# Altium schematic symbol library jlcpcb_2025_04_capacitors_extended_0201.schlib: 1175 symbols (part 4 of 7) (continued)
## GJM0335C1E9R2BB01D
designator C?  Capacitance: 9.2pF  (hidden comment: *)
Capacitor, Ceramic (MLCC), 9.2pF, 25V, C0G, SMD 0201; Manufacturer: Murata Electronics; Manufacturer Part Number: GJM0335C1E9R2BB01D; Package Size: 0201; JLCPCB Basic Part: No; JLCPCB Part Number: C3019008; Supplier 1: LCSC; Category: Capacitors - MLCC; Supplier Part Number 1: C3019008; Voltage Rating: 25V; Temperature Coefficient: C0G; RoHS: Yes; ComponentLink1Description: Datasheet; ComponentLink1URL: https://wmsc.lcsc.com/wmsc/upload/file/pdf/v2/lcsc/2205191730_Murata-Electronics-GJM0335C1E9R2BB01D_C3019008.pdf; ComponentLink2Description: JLCPCB Part URL; ComponentLink2URL: https://jlcpcb.com/partdetail/C3019008; ComponentLink3Description: LCSC Part URL; ComponentLink3URL: https://lcsc.com/product-detail/Multilayer-Ceramic-Capacitors-MLCC---SMD-SMT_Murata-Electronics-Murata-Electronics-GJM0335C1E9R2BB01D_C3019008.html
footprint CAP-0201 (0201 (0603M) Capacitor)
pins: 1, 2

## GJM0335C1E9R9BB01D
designator C?  Capacitance: 9.9pF  (hidden comment: *)
Capacitor, Ceramic (MLCC), 9.9pF, 25V, C0G, SMD 0201; Manufacturer: Murata Electronics; Manufacturer Part Number: GJM0335C1E9R9BB01D; Package Size: 0201; JLCPCB Basic Part: No; JLCPCB Part Number: C3018996; Supplier 1: LCSC; Category: Capacitors - MLCC; Supplier Part Number 1: C3018996; Voltage Rating: 25V; Temperature Coefficient: C0G; RoHS: Yes; ComponentLink1Description: Datasheet; ComponentLink1URL: https://wmsc.lcsc.com/wmsc/upload/file/pdf/v2/lcsc/2205191730_Murata-Electronics-GJM0335C1E9R9BB01D_C3018996.pdf; ComponentLink2Description: JLCPCB Part URL; ComponentLink2URL: https://jlcpcb.com/partdetail/C3018996; ComponentLink3Description: LCSC Part URL; ComponentLink3URL: https://lcsc.com/product-detail/Multilayer-Ceramic-Capacitors-MLCC---SMD-SMT_Murata-Electronics-Murata-Electronics-GJM0335C1E9R9BB01D_C3018996.html
footprint CAP-0201 (0201 (0603M) Capacitor)
pins: 1, 2

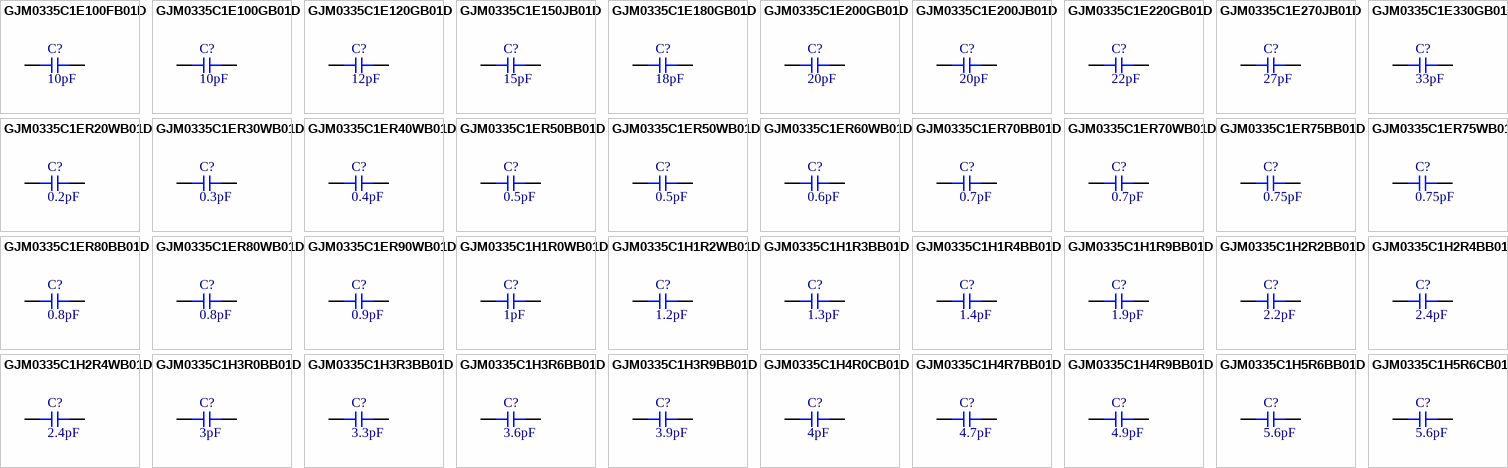
[diagram p15: symbols GJM0335C1E100FB01D to GJM0335C1H5R6CB01D]

## GJM0335C1E100FB01D
designator C?  Capacitance: 10pF  (hidden comment: *)
Capacitor, Ceramic (MLCC), 10pF, ±1%, 25V, C0G, ±1%, SMD 0201; Manufacturer: Murata Electronics; Manufacturer Part Number: GJM0335C1E100FB01D; Package Size: 0201; JLCPCB Basic Part: No; JLCPCB Part Number: C2891570; Supplier 1: LCSC; Category: Capacitors - MLCC; Supplier Part Number 1: C2891570; Tolerance: ±1%; Voltage Rating: 25V; Temperature Coefficient: C0G; RoHS: Yes; ComponentLink1Description: Datasheet; ComponentLink1URL: https://wmsc.lcsc.com/wmsc/upload/file/pdf/v2/lcsc/2109100930_Murata-Electronics-GJM0335C1E100FB01D_C2891570.pdf; ComponentLink2Description: JLCPCB Part URL; ComponentLink2URL: https://jlcpcb.com/partdetail/C2891570; ComponentLink3Description: LCSC Part URL; ComponentLink3URL: https://lcsc.com/product-detail/Multilayer-Ceramic-Capacitors-MLCC---SMD-SMT_Murata-Electronics-Murata-Electronics-GJM0335C1E100FB01D_C2891570.html
footprint CAP-0201 (0201 (0603M) Capacitor)
pins: 1, 2

## GJM0335C1E100GB01D
designator C?  Capacitance: 10pF  (hidden comment: *)
Capacitor, Ceramic (MLCC), 10pF, ±2%, 25V, C0G, ±2%, SMD 0201; Manufacturer: Murata Electronics; Manufacturer Part Number: GJM0335C1E100GB01D; Package Size: 0201; JLCPCB Basic Part: No; JLCPCB Part Number: C237422; Supplier 1: LCSC; Category: Capacitors - MLCC; Supplier Part Number 1: C237422; Tolerance: ±2%; Voltage Rating: 25V; Temperature Coefficient: C0G; RoHS: Yes; ComponentLink1Description: Datasheet; ComponentLink1URL: https://wmsc.lcsc.com/wmsc/upload/file/pdf/v2/lcsc/1912111437_Murata-Electronics-GJM0335C1E100GB01D_C237422.pdf; ComponentLink2Description: JLCPCB Part URL; ComponentLink2URL: https://jlcpcb.com/partdetail/C237422; ComponentLink3Description: LCSC Part URL; ComponentLink3URL: https://lcsc.com/product-detail/Multilayer-Ceramic-Capacitors-MLCC---SMD-SMT_Murata-Electronics-Murata-Electronics-GJM0335C1E100GB01D_C237422.html
footprint CAP-0201 (0201 (0603M) Capacitor)
pins: 1, 2

## GJM0335C1E120GB01D
designator C?  Capacitance: 12pF  (hidden comment: *)
Capacitor, Ceramic (MLCC), 12pF, ±2%, 25V, X6S, ±2%, SMD 0201; Manufacturer: Murata Electronics; Manufacturer Part Number: GJM0335C1E120GB01D; Package Size: 0201; JLCPCB Basic Part: No; JLCPCB Part Number: C710720; Supplier 1: LCSC; Category: Capacitors - MLCC; Supplier Part Number 1: C710720; Tolerance: ±2%; Voltage Rating: 25V; Temperature Coefficient: X6S; RoHS: Yes; ComponentLink1Description: Datasheet; ComponentLink1URL: https://wmsc.lcsc.com/wmsc/upload/file/pdf/v2/lcsc/2109180930_Murata-Electronics-GJM0335C1E120GB01D_C710720.pdf; ComponentLink2Description: JLCPCB Part URL; ComponentLink2URL: https://jlcpcb.com/partdetail/C710720; ComponentLink3Description: LCSC Part URL; ComponentLink3URL: https://lcsc.com/product-detail/Multilayer-Ceramic-Capacitors-MLCC---SMD-SMT_Murata-Electronics-Murata-Electronics-GJM0335C1E120GB01D_C710720.html
footprint CAP-0201 (0201 (0603M) Capacitor)
pins: 1, 2

## GJM0335C1E150JB01D
designator C?  Capacitance: 15pF  (hidden comment: *)
Capacitor, Ceramic (MLCC), 15pF, ±5%, 25V, null, ±5%, SMD 0201; Manufacturer: Murata Electronics; Manufacturer Part Number: GJM0335C1E150JB01D; Package Size: 0201; JLCPCB Basic Part: No; JLCPCB Part Number: C710722; Supplier 1: LCSC; Category: Capacitors - MLCC; Supplier Part Number 1: C710722; Tolerance: ±5%; Voltage Rating: 25V; Temperature Coefficient: null; RoHS: Yes; ComponentLink1Description: Datasheet; ComponentLink1URL: https://wmsc.lcsc.com/wmsc/upload/file/pdf/v2/lcsc/2103161033_Murata-Electronics-GJM0335C1E150JB01D_C710722.pdf; ComponentLink2Description: JLCPCB Part URL; ComponentLink2URL: https://jlcpcb.com/partdetail/C710722; ComponentLink3Description: LCSC Part URL; ComponentLink3URL: https://lcsc.com/product-detail/Multilayer-Ceramic-Capacitors-MLCC---SMD-SMT_Murata-Electronics-Murata-Electronics-GJM0335C1E150JB01D_C710722.html
footprint CAP-0201 (0201 (0603M) Capacitor)
pins: 1, 2

## GJM0335C1E180GB01D
designator C?  Capacitance: 18pF  (hidden comment: *)
Capacitor, Ceramic (MLCC), 18pF, ±2%, 25V, null, ±2%, SMD 0201; Manufacturer: Murata Electronics; Manufacturer Part Number: GJM0335C1E180GB01D; Package Size: 0201; JLCPCB Basic Part: No; JLCPCB Part Number: C913481; Supplier 1: LCSC; Category: Capacitors - MLCC; Supplier Part Number 1: C913481; Tolerance: ±2%; Voltage Rating: 25V; Temperature Coefficient: null; RoHS: Yes; ComponentLink1Description: Datasheet; ComponentLink1URL: https://wmsc.lcsc.com/wmsc/upload/file/pdf/v2/lcsc/2308111814_Murata-Electronics-GJM0335C1E180GB01D_C913481.pdf; ComponentLink2Description: JLCPCB Part URL; ComponentLink2URL: https://jlcpcb.com/partdetail/C913481; ComponentLink3Description: LCSC Part URL; ComponentLink3URL: https://lcsc.com/product-detail/Multilayer-Ceramic-Capacitors-MLCC---SMD-SMT_Murata-Electronics-Murata-Electronics-GJM0335C1E180GB01D_C913481.html
footprint CAP-0201 (0201 (0603M) Capacitor)
pins: 1, 2

## GJM0335C1E200GB01D
designator C?  Capacitance: 20pF  (hidden comment: *)
Capacitor, Ceramic (MLCC), 20pF, ±2%, 25V, C0G, ±2%, SMD 0201; Manufacturer: Murata Electronics; Manufacturer Part Number: GJM0335C1E200GB01D; Package Size: 0201; JLCPCB Basic Part: No; JLCPCB Part Number: C426116; Supplier 1: LCSC; Category: Capacitors - MLCC; Supplier Part Number 1: C426116; Tolerance: ±2%; Voltage Rating: 25V; Temperature Coefficient: C0G; RoHS: Yes; ComponentLink1Description: Datasheet; ComponentLink1URL: https://wmsc.lcsc.com/wmsc/upload/file/pdf/v2/lcsc/2109180930_Murata-Electronics-GJM0335C1E200GB01D_C426116.pdf; ComponentLink2Description: JLCPCB Part URL; ComponentLink2URL: https://jlcpcb.com/partdetail/C426116; ComponentLink3Description: LCSC Part URL; ComponentLink3URL: https://lcsc.com/product-detail/Multilayer-Ceramic-Capacitors-MLCC---SMD-SMT_Murata-Electronics-Murata-Electronics-GJM0335C1E200GB01D_C426116.html
footprint CAP-0201 (0201 (0603M) Capacitor)
pins: 1, 2

## GJM0335C1E200JB01D
designator C?  Capacitance: 20pF  (hidden comment: *)
Capacitor, Ceramic (MLCC), 20pF, ±5%, 25V, null, ±5%, SMD 0201; Manufacturer: Murata Electronics; Manufacturer Part Number: GJM0335C1E200JB01D; Package Size: 0201; JLCPCB Basic Part: No; JLCPCB Part Number: C710728; Supplier 1: LCSC; Category: Capacitors - MLCC; Supplier Part Number 1: C710728; Tolerance: ±5%; Voltage Rating: 25V; Temperature Coefficient: null; RoHS: Yes; ComponentLink1Description: Datasheet; ComponentLink1URL: https://wmsc.lcsc.com/wmsc/upload/file/pdf/v2/lcsc/2304140030_Murata-Electronics-GJM0335C1E200JB01D_C710728.pdf; ComponentLink2Description: JLCPCB Part URL; ComponentLink2URL: https://jlcpcb.com/partdetail/C710728; ComponentLink3Description: LCSC Part URL; ComponentLink3URL: https://lcsc.com/product-detail/Multilayer-Ceramic-Capacitors-MLCC---SMD-SMT_Murata-Electronics-Murata-Electronics-GJM0335C1E200JB01D_C710728.html
footprint CAP-0201 (0201 (0603M) Capacitor)
pins: 1, 2

## GJM0335C1E220GB01D
designator C?  Capacitance: 22pF  (hidden comment: *)
Capacitor, Ceramic (MLCC), 22pF, ±2%, 25V, C0G, ±2%, SMD 0201; Manufacturer: Murata Electronics; Manufacturer Part Number: GJM0335C1E220GB01D; Package Size: 0201; JLCPCB Basic Part: No; JLCPCB Part Number: C710729; Supplier 1: LCSC; Category: Capacitors - MLCC; Supplier Part Number 1: C710729; Tolerance: ±2%; Voltage Rating: 25V; Temperature Coefficient: C0G; RoHS: Yes; ComponentLink1Description: Datasheet; ComponentLink1URL: https://wmsc.lcsc.com/wmsc/upload/file/pdf/v2/lcsc/2104061735_Murata-Electronics-GJM0335C1E220GB01D_C710729.pdf; ComponentLink2Description: JLCPCB Part URL; ComponentLink2URL: https://jlcpcb.com/partdetail/C710729; ComponentLink3Description: LCSC Part URL; ComponentLink3URL: https://lcsc.com/product-detail/Multilayer-Ceramic-Capacitors-MLCC---SMD-SMT_Murata-Electronics-Murata-Electronics-GJM0335C1E220GB01D_C710729.html
footprint CAP-0201 (0201 (0603M) Capacitor)
pins: 1, 2

## GJM0335C1E270JB01D
designator C?  Capacitance: 27pF  (hidden comment: *)
Capacitor, Ceramic (MLCC), 27pF, ±5%, 25V, null, ±5%, SMD 0201; Manufacturer: Murata Electronics; Manufacturer Part Number: GJM0335C1E270JB01D; Package Size: 0201; JLCPCB Basic Part: No; JLCPCB Part Number: C913530; Supplier 1: LCSC; Category: Capacitors - MLCC; Supplier Part Number 1: C913530; Tolerance: ±5%; Voltage Rating: 25V; Temperature Coefficient: null; RoHS: Yes; ComponentLink1Description: Datasheet; ComponentLink1URL: https://wmsc.lcsc.com/wmsc/upload/file/pdf/v2/lcsc/2308111614_Murata-Electronics-GJM0335C1E270JB01D_C913530.pdf; ComponentLink2Description: JLCPCB Part URL; ComponentLink2URL: https://jlcpcb.com/partdetail/C913530; ComponentLink3Description: LCSC Part URL; ComponentLink3URL: https://lcsc.com/product-detail/Multilayer-Ceramic-Capacitors-MLCC---SMD-SMT_Murata-Electronics-Murata-Electronics-GJM0335C1E270JB01D_C913530.html
footprint CAP-0201 (0201 (0603M) Capacitor)
pins: 1, 2

## GJM0335C1E330GB01D
designator C?  Capacitance: 33pF  (hidden comment: *)
Capacitor, Ceramic (MLCC), 33pF, ±2%, 25V, C0G, ±2%, SMD 0201; Manufacturer: Murata Electronics; Manufacturer Part Number: GJM0335C1E330GB01D; Package Size: 0201; JLCPCB Basic Part: No; JLCPCB Part Number: C2896796; Supplier 1: LCSC; Category: Capacitors - MLCC; Supplier Part Number 1: C2896796; Tolerance: ±2%; Voltage Rating: 25V; Temperature Coefficient: C0G; RoHS: Yes; ComponentLink1Description: Datasheet; ComponentLink1URL: https://wmsc.lcsc.com/wmsc/upload/file/pdf/v2/lcsc/2109180930_Murata-Electronics-GJM0335C1E330GB01D_C2896796.pdf; ComponentLink2Description: JLCPCB Part URL; ComponentLink2URL: https://jlcpcb.com/partdetail/C2896796; ComponentLink3Description: LCSC Part URL; ComponentLink3URL: https://lcsc.com/product-detail/Multilayer-Ceramic-Capacitors-MLCC---SMD-SMT_Murata-Electronics-Murata-Electronics-GJM0335C1E330GB01D_C2896796.html
footprint CAP-0201 (0201 (0603M) Capacitor)
pins: 1, 2

## GJM0335C1ER20WB01D
designator C?  Capacitance: 0.2pF  (hidden comment: *)
Capacitor, Ceramic (MLCC), 0.2pF, 25V, null, SMD 0201; Manufacturer: Murata Electronics; Manufacturer Part Number: GJM0335C1ER20WB01D; Package Size: 0201; JLCPCB Basic Part: No; JLCPCB Part Number: C913527; Supplier 1: LCSC; Category: Capacitors - MLCC; Supplier Part Number 1: C913527; Voltage Rating: 25V; Temperature Coefficient: null; RoHS: Yes; ComponentLink1Description: Datasheet; ComponentLink1URL: https://wmsc.lcsc.com/wmsc/upload/file/pdf/v2/lcsc/2308111814_Murata-Electronics-GJM0335C1ER20WB01D_C913527.pdf; ComponentLink2Description: JLCPCB Part URL; ComponentLink2URL: https://jlcpcb.com/partdetail/C913527; ComponentLink3Description: LCSC Part URL; ComponentLink3URL: https://lcsc.com/product-detail/Multilayer-Ceramic-Capacitors-MLCC---SMD-SMT_Murata-Electronics-Murata-Electronics-GJM0335C1ER20WB01D_C913527.html
footprint CAP-0201 (0201 (0603M) Capacitor)
pins: 1, 2

## GJM0335C1ER30WB01D
designator C?  Capacitance: 0.3pF  (hidden comment: *)
Capacitor, Ceramic (MLCC), 0.3pF, 25V, C0G, SMD 0201; Manufacturer: Murata Electronics; Manufacturer Part Number: GJM0335C1ER30WB01D; Package Size: 0201; JLCPCB Basic Part: No; JLCPCB Part Number: C161289; Supplier 1: LCSC; Category: Capacitors - MLCC; Supplier Part Number 1: C161289; Voltage Rating: 25V; Temperature Coefficient: C0G; RoHS: Yes; ComponentLink1Description: Datasheet; ComponentLink1URL: https://wmsc.lcsc.com/wmsc/upload/file/pdf/v2/lcsc/2304140030_Murata-Electronics-GJM0335C1ER30WB01D_C161289.pdf; ComponentLink2Description: JLCPCB Part URL; ComponentLink2URL: https://jlcpcb.com/partdetail/C161289; ComponentLink3Description: LCSC Part URL; ComponentLink3URL: https://lcsc.com/product-detail/Multilayer-Ceramic-Capacitors-MLCC---SMD-SMT_Murata-Electronics-Murata-Electronics-GJM0335C1ER30WB01D_C161289.html
footprint CAP-0201 (0201 (0603M) Capacitor)
pins: 1, 2

## GJM0335C1ER40WB01D
designator C?  Capacitance: 0.4pF  (hidden comment: *)
Capacitor, Ceramic (MLCC), 0.4pF, 25V, C0G, SMD 0201; Manufacturer: Murata Electronics; Manufacturer Part Number: GJM0335C1ER40WB01D; Package Size: 0201; JLCPCB Basic Part: No; JLCPCB Part Number: C161291; Supplier 1: LCSC; Category: Capacitors - MLCC; Supplier Part Number 1: C161291; Voltage Rating: 25V; Temperature Coefficient: C0G; RoHS: Yes; ComponentLink1Description: Datasheet; ComponentLink1URL: https://wmsc.lcsc.com/wmsc/upload/file/pdf/v2/lcsc/2304140030_Murata-Electronics-GJM0335C1ER40WB01D_C161291.pdf; ComponentLink2Description: JLCPCB Part URL; ComponentLink2URL: https://jlcpcb.com/partdetail/C161291; ComponentLink3Description: LCSC Part URL; ComponentLink3URL: https://lcsc.com/product-detail/Multilayer-Ceramic-Capacitors-MLCC---SMD-SMT_Murata-Electronics-Murata-Electronics-GJM0335C1ER40WB01D_C161291.html
footprint CAP-0201 (0201 (0603M) Capacitor)
pins: 1, 2

## GJM0335C1ER50BB01D
designator C?  Capacitance: 0.5pF  (hidden comment: *)
Capacitor, Ceramic (MLCC), 0.5pF, 25V, C0G, SMD 0201; Manufacturer: Murata Electronics; Manufacturer Part Number: GJM0335C1ER50BB01D; Package Size: 0201; JLCPCB Basic Part: No; JLCPCB Part Number: C161292; Supplier 1: LCSC; Category: Capacitors - MLCC; Supplier Part Number 1: C161292; Voltage Rating: 25V; Temperature Coefficient: C0G; RoHS: Yes; ComponentLink1Description: Datasheet; ComponentLink1URL: https://wmsc.lcsc.com/wmsc/upload/file/pdf/v2/lcsc/2304140030_Murata-Electronics-GJM0335C1ER50BB01D_C161292.pdf; ComponentLink2Description: JLCPCB Part URL; ComponentLink2URL: https://jlcpcb.com/partdetail/C161292; ComponentLink3Description: LCSC Part URL; ComponentLink3URL: https://lcsc.com/product-detail/Multilayer-Ceramic-Capacitors-MLCC---SMD-SMT_Murata-Electronics-Murata-Electronics-GJM0335C1ER50BB01D_C161292.html
footprint CAP-0201 (0201 (0603M) Capacitor)
pins: 1, 2

## GJM0335C1ER50WB01D
designator C?  Capacitance: 0.5pF  (hidden comment: *)
Capacitor, Ceramic (MLCC), 0.5pF, 25V, C0G, SMD 0201; Manufacturer: Murata Electronics; Manufacturer Part Number: GJM0335C1ER50WB01D; Package Size: 0201; JLCPCB Basic Part: No; JLCPCB Part Number: C464955; Supplier 1: LCSC; Category: Capacitors - MLCC; Supplier Part Number 1: C464955; Voltage Rating: 25V; Temperature Coefficient: C0G; RoHS: Yes; ComponentLink1Description: Datasheet; ComponentLink1URL: https://wmsc.lcsc.com/wmsc/upload/file/pdf/v2/lcsc/1912111437_Murata-Electronics-GJM0335C1ER50WB01D_C464955.pdf; ComponentLink2Description: JLCPCB Part URL; ComponentLink2URL: https://jlcpcb.com/partdetail/C464955; ComponentLink3Description: LCSC Part URL; ComponentLink3URL: https://lcsc.com/product-detail/Multilayer-Ceramic-Capacitors-MLCC---SMD-SMT_Murata-Electronics-Murata-Electronics-GJM0335C1ER50WB01D_C464955.html
footprint CAP-0201 (0201 (0603M) Capacitor)
pins: 1, 2

## GJM0335C1ER60WB01D
designator C?  Capacitance: 0.6pF  (hidden comment: *)
Capacitor, Ceramic (MLCC), 0.6pF, 25V, C0G, SMD 0201; Manufacturer: Murata Electronics; Manufacturer Part Number: GJM0335C1ER60WB01D; Package Size: 0201; JLCPCB Basic Part: No; JLCPCB Part Number: C415526; Supplier 1: LCSC; Category: Capacitors - MLCC; Supplier Part Number 1: C415526; Voltage Rating: 25V; Temperature Coefficient: C0G; RoHS: Yes; ComponentLink1Description: Datasheet; ComponentLink1URL: https://wmsc.lcsc.com/wmsc/upload/file/pdf/v2/lcsc/2304140030_Murata-Electronics-GJM0335C1ER60WB01D_C415526.pdf; ComponentLink2Description: JLCPCB Part URL; ComponentLink2URL: https://jlcpcb.com/partdetail/C415526; ComponentLink3Description: LCSC Part URL; ComponentLink3URL: https://lcsc.com/product-detail/Multilayer-Ceramic-Capacitors-MLCC---SMD-SMT_Murata-Electronics-Murata-Electronics-GJM0335C1ER60WB01D_C415526.html
footprint CAP-0201 (0201 (0603M) Capacitor)
pins: 1, 2

## GJM0335C1ER70BB01D
designator C?  Capacitance: 0.7pF  (hidden comment: *)
Capacitor, Ceramic (MLCC), 0.7pF, 25V, C0G, SMD 0201; Manufacturer: Murata Electronics; Manufacturer Part Number: GJM0335C1ER70BB01D; Package Size: 0201; JLCPCB Basic Part: No; JLCPCB Part Number: C161293; Supplier 1: LCSC; Category: Capacitors - MLCC; Supplier Part Number 1: C161293; Voltage Rating: 25V; Temperature Coefficient: C0G; RoHS: Yes; ComponentLink1Description: Datasheet; ComponentLink1URL: https://wmsc.lcsc.com/wmsc/upload/file/pdf/v2/lcsc/1811081512_Murata-Electronics-GJM0335C1ER70BB01D_C161293.pdf; ComponentLink2Description: JLCPCB Part URL; ComponentLink2URL: https://jlcpcb.com/partdetail/C161293; ComponentLink3Description: LCSC Part URL; ComponentLink3URL: https://lcsc.com/product-detail/Multilayer-Ceramic-Capacitors-MLCC---SMD-SMT_Murata-Electronics-Murata-Electronics-GJM0335C1ER70BB01D_C161293.html
footprint CAP-0201 (0201 (0603M) Capacitor)
pins: 1, 2

## GJM0335C1ER70WB01D
designator C?  Capacitance: 0.7pF  (hidden comment: *)
Capacitor, Ceramic (MLCC), 0.7pF, 25V, null, SMD 0201; Manufacturer: Murata Electronics; Manufacturer Part Number: GJM0335C1ER70WB01D; Package Size: 0201; JLCPCB Basic Part: No; JLCPCB Part Number: C907945; Supplier 1: LCSC; Category: Capacitors - MLCC; Supplier Part Number 1: C907945; Voltage Rating: 25V; Temperature Coefficient: null; RoHS: Yes; ComponentLink1Description: Datasheet; ComponentLink1URL: https://wmsc.lcsc.com/wmsc/upload/file/pdf/v2/lcsc/2201242100_Murata-Electronics-GJM0335C1ER70WB01D_C907945.pdf; ComponentLink2Description: JLCPCB Part URL; ComponentLink2URL: https://jlcpcb.com/partdetail/C907945; ComponentLink3Description: LCSC Part URL; ComponentLink3URL: https://lcsc.com/product-detail/Multilayer-Ceramic-Capacitors-MLCC---SMD-SMT_Murata-Electronics-Murata-Electronics-GJM0335C1ER70WB01D_C907945.html
footprint CAP-0201 (0201 (0603M) Capacitor)
pins: 1, 2

## GJM0335C1ER75BB01D
designator C?  Capacitance: 0.75pF  (hidden comment: *)
Capacitor, Ceramic (MLCC), 0.75pF, SMD 0201; Manufacturer: Murata Electronics; Manufacturer Part Number: GJM0335C1ER75BB01D; Package Size: 0201; JLCPCB Basic Part: No; JLCPCB Part Number: C710743; Supplier 1: LCSC; Category: Capacitors - MLCC; Supplier Part Number 1: C710743; RoHS: Yes; ComponentLink1Description: Datasheet; ComponentLink1URL: https://wmsc.lcsc.com/wmsc/upload/file/pdf/v2/lcsc/2103161034_Murata-Electronics-GJM0335C1ER75BB01D_C710743.pdf; ComponentLink2Description: JLCPCB Part URL; ComponentLink2URL: https://jlcpcb.com/partdetail/C710743; ComponentLink3Description: LCSC Part URL; ComponentLink3URL: https://lcsc.com/product-detail/Multilayer-Ceramic-Capacitors-MLCC---SMD-SMT_Murata-Electronics-Murata-Electronics-GJM0335C1ER75BB01D_C710743.html
footprint CAP-0201 (0201 (0603M) Capacitor)
pins: 1, 2

## GJM0335C1ER75WB01D
designator C?  Capacitance: 0.75pF  (hidden comment: *)
Capacitor, Ceramic (MLCC), 0.75pF, 25V, C0G, SMD 0201; Manufacturer: Murata Electronics; Manufacturer Part Number: GJM0335C1ER75WB01D; Package Size: 0201; JLCPCB Basic Part: No; JLCPCB Part Number: C237289; Supplier 1: LCSC; Category: Capacitors - MLCC; Supplier Part Number 1: C237289; Voltage Rating: 25V; Temperature Coefficient: C0G; RoHS: Yes; ComponentLink1Description: Datasheet; ComponentLink1URL: https://wmsc.lcsc.com/wmsc/upload/file/pdf/v2/lcsc/1912111437_Murata-Electronics-GJM0335C1ER75WB01D_C237289.pdf; ComponentLink2Description: JLCPCB Part URL; ComponentLink2URL: https://jlcpcb.com/partdetail/C237289; ComponentLink3Description: LCSC Part URL; ComponentLink3URL: https://lcsc.com/product-detail/Multilayer-Ceramic-Capacitors-MLCC---SMD-SMT_Murata-Electronics-Murata-Electronics-GJM0335C1ER75WB01D_C237289.html
footprint CAP-0201 (0201 (0603M) Capacitor)
pins: 1, 2

## GJM0335C1ER80BB01D
designator C?  Capacitance: 0.8pF  (hidden comment: *)
Capacitor, Ceramic (MLCC), 0.8pF, 25V, C0G, SMD 0201; Manufacturer: Murata Electronics; Manufacturer Part Number: GJM0335C1ER80BB01D; Package Size: 0201; JLCPCB Basic Part: No; JLCPCB Part Number: C161294; Supplier 1: LCSC; Category: Capacitors - MLCC; Supplier Part Number 1: C161294; Voltage Rating: 25V; Temperature Coefficient: C0G; RoHS: Yes; ComponentLink1Description: Datasheet; ComponentLink1URL: https://wmsc.lcsc.com/wmsc/upload/file/pdf/v2/lcsc/2304140030_Murata-Electronics-GJM0335C1ER80BB01D_C161294.pdf; ComponentLink2Description: JLCPCB Part URL; ComponentLink2URL: https://jlcpcb.com/partdetail/C161294; ComponentLink3Description: LCSC Part URL; ComponentLink3URL: https://lcsc.com/product-detail/Multilayer-Ceramic-Capacitors-MLCC---SMD-SMT_Murata-Electronics-Murata-Electronics-GJM0335C1ER80BB01D_C161294.html
footprint CAP-0201 (0201 (0603M) Capacitor)
pins: 1, 2

## GJM0335C1ER80WB01D
designator C?  Capacitance: 0.8pF  (hidden comment: *)
Capacitor, Ceramic (MLCC), 0.8pF, 25V, C0G, SMD 0201; Manufacturer: Murata Electronics; Manufacturer Part Number: GJM0335C1ER80WB01D; Package Size: 0201; JLCPCB Basic Part: No; JLCPCB Part Number: C408126; Supplier 1: LCSC; Category: Capacitors - MLCC; Supplier Part Number 1: C408126; Voltage Rating: 25V; Temperature Coefficient: C0G; RoHS: Yes; ComponentLink1Description: Datasheet; ComponentLink1URL: https://wmsc.lcsc.com/wmsc/upload/file/pdf/v2/lcsc/2304140030_Murata-Electronics-GJM0335C1ER80WB01D_C408126.pdf; ComponentLink2Description: JLCPCB Part URL; ComponentLink2URL: https://jlcpcb.com/partdetail/C408126; ComponentLink3Description: LCSC Part URL; ComponentLink3URL: https://lcsc.com/product-detail/Multilayer-Ceramic-Capacitors-MLCC---SMD-SMT_Murata-Electronics-Murata-Electronics-GJM0335C1ER80WB01D_C408126.html
footprint CAP-0201 (0201 (0603M) Capacitor)
pins: 1, 2

## GJM0335C1ER90WB01D
designator C?  Capacitance: 0.9pF  (hidden comment: *)
Capacitor, Ceramic (MLCC), 0.9pF, 25V, C0G, SMD 0201; Manufacturer: Murata Electronics; Manufacturer Part Number: GJM0335C1ER90WB01D; Package Size: 0201; JLCPCB Basic Part: No; JLCPCB Part Number: C471401; Supplier 1: LCSC; Category: Capacitors - MLCC; Supplier Part Number 1: C471401; Voltage Rating: 25V; Temperature Coefficient: C0G; RoHS: Yes; ComponentLink1Description: Datasheet; ComponentLink1URL: https://wmsc.lcsc.com/wmsc/upload/file/pdf/v2/lcsc/2001071134_Murata-Electronics-GJM0335C1ER90WB01D_C471401.pdf; ComponentLink2Description: JLCPCB Part URL; ComponentLink2URL: https://jlcpcb.com/partdetail/C471401; ComponentLink3Description: LCSC Part URL; ComponentLink3URL: https://lcsc.com/product-detail/Multilayer-Ceramic-Capacitors-MLCC---SMD-SMT_Murata-Electronics-Murata-Electronics-GJM0335C1ER90WB01D_C471401.html
footprint CAP-0201 (0201 (0603M) Capacitor)
pins: 1, 2

## GJM0335C1H1R0WB01D
designator C?  Capacitance: 1pF  (hidden comment: *)
Capacitor, Ceramic (MLCC), 1pF, 50V, C0G, SMD 0201; Manufacturer: Murata Electronics; Manufacturer Part Number: GJM0335C1H1R0WB01D; Package Size: 0201; JLCPCB Basic Part: No; JLCPCB Part Number: C723324; Supplier 1: LCSC; Category: Capacitors - MLCC; Supplier Part Number 1: C723324; Voltage Rating: 50V; Temperature Coefficient: C0G; RoHS: Yes; ComponentLink1Description: Datasheet; ComponentLink1URL: https://wmsc.lcsc.com/wmsc/upload/file/pdf/v2/lcsc/2008241234_Murata-Electronics-GJM0335C1H1R0WB01D_C723324.pdf; ComponentLink2Description: JLCPCB Part URL; ComponentLink2URL: https://jlcpcb.com/partdetail/C723324; ComponentLink3Description: LCSC Part URL; ComponentLink3URL: https://lcsc.com/product-detail/Multilayer-Ceramic-Capacitors-MLCC---SMD-SMT_Murata-Electronics-Murata-Electronics-GJM0335C1H1R0WB01D_C723324.html
footprint CAP-0201 (0201 (0603M) Capacitor)
pins: 1, 2

## GJM0335C1H1R2WB01D
designator C?  Capacitance: 1.2pF  (hidden comment: *)
Capacitor, Ceramic (MLCC), 1.2pF, 50V, C0G, SMD 0201; Manufacturer: Murata Electronics; Manufacturer Part Number: GJM0335C1H1R2WB01D; Package Size: 0201; JLCPCB Basic Part: No; JLCPCB Part Number: C1864231; Supplier 1: LCSC; Category: Capacitors - MLCC; Supplier Part Number 1: C1864231; Voltage Rating: 50V; Temperature Coefficient: C0G; RoHS: Yes; ComponentLink1Description: Datasheet; ComponentLink1URL: https://wmsc.lcsc.com/wmsc/upload/file/pdf/v2/lcsc/2201271800_Murata-Electronics-GJM0335C1H1R2WB01D_C1864231.pdf; ComponentLink2Description: JLCPCB Part URL; ComponentLink2URL: https://jlcpcb.com/partdetail/C1864231; ComponentLink3Description: LCSC Part URL; ComponentLink3URL: https://lcsc.com/product-detail/Multilayer-Ceramic-Capacitors-MLCC---SMD-SMT_Murata-Electronics-Murata-Electronics-GJM0335C1H1R2WB01D_C1864231.html
footprint CAP-0201 (0201 (0603M) Capacitor)
pins: 1, 2

## GJM0335C1H1R3BB01D
designator C?  Capacitance: 1.3pF  (hidden comment: *)
Capacitor, Ceramic (MLCC), 1.3pF, null, null, SMD 0201; Manufacturer: Murata Electronics; Manufacturer Part Number: GJM0335C1H1R3BB01D; Package Size: 0201; JLCPCB Basic Part: No; JLCPCB Part Number: C913511; Supplier 1: LCSC; Category: Capacitors - MLCC; Supplier Part Number 1: C913511; Voltage Rating: null; Temperature Coefficient: null; RoHS: Yes; ComponentLink1Description: Datasheet; ComponentLink1URL: https://wmsc.lcsc.com/wmsc/upload/file/pdf/v2/lcsc/2308111814_Murata-Electronics-GJM0335C1H1R3BB01D_C913511.pdf; ComponentLink2Description: JLCPCB Part URL; ComponentLink2URL: https://jlcpcb.com/partdetail/C913511; ComponentLink3Description: LCSC Part URL; ComponentLink3URL: https://lcsc.com/product-detail/Multilayer-Ceramic-Capacitors-MLCC---SMD-SMT_Murata-Electronics-Murata-Electronics-GJM0335C1H1R3BB01D_C913511.html
footprint CAP-0201 (0201 (0603M) Capacitor)
pins: 1, 2

## GJM0335C1H1R4BB01D
designator C?  Capacitance: 1.4pF  (hidden comment: *)
Capacitor, Ceramic (MLCC), 1.4pF, 50V, null, SMD 0201; Manufacturer: Murata Electronics; Manufacturer Part Number: GJM0335C1H1R4BB01D; Package Size: 0201; JLCPCB Basic Part: No; JLCPCB Part Number: C2180749; Supplier 1: LCSC; Category: Capacitors - MLCC; Supplier Part Number 1: C2180749; Voltage Rating: 50V; Temperature Coefficient: null; RoHS: Yes; ComponentLink1Description: Datasheet; ComponentLink1URL: https://wmsc.lcsc.com/wmsc/upload/file/pdf/v2/lcsc/2202041130_Murata-Electronics-GJM0335C1H1R4BB01D_C2180749.pdf; ComponentLink2Description: JLCPCB Part URL; ComponentLink2URL: https://jlcpcb.com/partdetail/C2180749; ComponentLink3Description: LCSC Part URL; ComponentLink3URL: https://lcsc.com/product-detail/Multilayer-Ceramic-Capacitors-MLCC---SMD-SMT_Murata-Electronics-Murata-Electronics-GJM0335C1H1R4BB01D_C2180749.html
footprint CAP-0201 (0201 (0603M) Capacitor)
pins: 1, 2

## GJM0335C1H1R9BB01D
designator C?  Capacitance: 1.9pF  (hidden comment: *)
Capacitor, Ceramic (MLCC), 1.9pF, 50V, null, SMD 0201; Manufacturer: Murata Electronics; Manufacturer Part Number: GJM0335C1H1R9BB01D; Package Size: 0201; JLCPCB Basic Part: No; JLCPCB Part Number: C2180880; Supplier 1: LCSC; Category: Capacitors - MLCC; Supplier Part Number 1: C2180880; Voltage Rating: 50V; Temperature Coefficient: null; RoHS: Yes; ComponentLink1Description: Datasheet; ComponentLink1URL: https://wmsc.lcsc.com/wmsc/upload/file/pdf/v2/lcsc/2202041130_Murata-Electronics-GJM0335C1H1R9BB01D_C2180880.pdf; ComponentLink2Description: JLCPCB Part URL; ComponentLink2URL: https://jlcpcb.com/partdetail/C2180880; ComponentLink3Description: LCSC Part URL; ComponentLink3URL: https://lcsc.com/product-detail/Multilayer-Ceramic-Capacitors-MLCC---SMD-SMT_Murata-Electronics-Murata-Electronics-GJM0335C1H1R9BB01D_C2180880.html
footprint CAP-0201 (0201 (0603M) Capacitor)
pins: 1, 2

## GJM0335C1H2R2BB01D
designator C?  Capacitance: 2.2pF  (hidden comment: *)
Capacitor, Ceramic (MLCC), 2.2pF, 50V, C0G, SMD 0201; Manufacturer: Murata Electronics; Manufacturer Part Number: GJM0335C1H2R2BB01D; Package Size: 0201; JLCPCB Basic Part: No; JLCPCB Part Number: C161295; Supplier 1: LCSC; Category: Capacitors - MLCC; Supplier Part Number 1: C161295; Voltage Rating: 50V; Temperature Coefficient: C0G; RoHS: Yes; ComponentLink1Description: Datasheet; ComponentLink1URL: https://wmsc.lcsc.com/wmsc/upload/file/pdf/v2/lcsc/2304140030_Murata-Electronics-GJM0335C1H2R2BB01D_C161295.pdf; ComponentLink2Description: JLCPCB Part URL; ComponentLink2URL: https://jlcpcb.com/partdetail/C161295; ComponentLink3Description: LCSC Part URL; ComponentLink3URL: https://lcsc.com/product-detail/Multilayer-Ceramic-Capacitors-MLCC---SMD-SMT_Murata-Electronics-Murata-Electronics-GJM0335C1H2R2BB01D_C161295.html
footprint CAP-0201 (0201 (0603M) Capacitor)
pins: 1, 2

## GJM0335C1H2R4BB01D
designator C?  Capacitance: 2.4pF  (hidden comment: *)
Capacitor, Ceramic (MLCC), 2.4pF, null, null, SMD 0201; Manufacturer: Murata Electronics; Manufacturer Part Number: GJM0335C1H2R4BB01D; Package Size: 0201; JLCPCB Basic Part: No; JLCPCB Part Number: C913503; Supplier 1: LCSC; Category: Capacitors - MLCC; Supplier Part Number 1: C913503; Voltage Rating: null; Temperature Coefficient: null; RoHS: Yes; ComponentLink1Description: Datasheet; ComponentLink1URL: https://wmsc.lcsc.com/wmsc/upload/file/pdf/v2/lcsc/2308111814_Murata-Electronics-GJM0335C1H2R4BB01D_C913503.pdf; ComponentLink2Description: JLCPCB Part URL; ComponentLink2URL: https://jlcpcb.com/partdetail/C913503; ComponentLink3Description: LCSC Part URL; ComponentLink3URL: https://lcsc.com/product-detail/Multilayer-Ceramic-Capacitors-MLCC---SMD-SMT_Murata-Electronics-Murata-Electronics-GJM0335C1H2R4BB01D_C913503.html
footprint CAP-0201 (0201 (0603M) Capacitor)
pins: 1, 2

## GJM0335C1H2R4WB01D
designator C?  Capacitance: 2.4pF  (hidden comment: *)
Capacitor, Ceramic (MLCC), 2.4pF, 50V, C0G, SMD 0201; Manufacturer: Murata Electronics; Manufacturer Part Number: GJM0335C1H2R4WB01D; Package Size: 0201; JLCPCB Basic Part: No; JLCPCB Part Number: C1864607; Supplier 1: LCSC; Category: Capacitors - MLCC; Supplier Part Number 1: C1864607; Voltage Rating: 50V; Temperature Coefficient: C0G; RoHS: Yes; ComponentLink1Description: Datasheet; ComponentLink1URL: https://wmsc.lcsc.com/wmsc/upload/file/pdf/v2/lcsc/2201271830_Murata-Electronics-GJM0335C1H2R4WB01D_C1864607.pdf; ComponentLink2Description: JLCPCB Part URL; ComponentLink2URL: https://jlcpcb.com/partdetail/C1864607; ComponentLink3Description: LCSC Part URL; ComponentLink3URL: https://lcsc.com/product-detail/Multilayer-Ceramic-Capacitors-MLCC---SMD-SMT_Murata-Electronics-Murata-Electronics-GJM0335C1H2R4WB01D_C1864607.html
footprint CAP-0201 (0201 (0603M) Capacitor)
pins: 1, 2

## GJM0335C1H3R0BB01D
designator C?  Capacitance: 3pF  (hidden comment: *)
Capacitor, Ceramic (MLCC), 3pF, 50V, null, SMD 0201; Manufacturer: Murata Electronics; Manufacturer Part Number: GJM0335C1H3R0BB01D; Package Size: 0201; JLCPCB Basic Part: No; JLCPCB Part Number: C2176211; Supplier 1: LCSC; Category: Capacitors - MLCC; Supplier Part Number 1: C2176211; Voltage Rating: 50V; Temperature Coefficient: null; RoHS: Yes; ComponentLink1Description: Datasheet; ComponentLink1URL: https://wmsc.lcsc.com/wmsc/upload/file/pdf/v2/lcsc/2202040800_Murata-Electronics-GJM0335C1H3R0BB01D_C2176211.pdf; ComponentLink2Description: JLCPCB Part URL; ComponentLink2URL: https://jlcpcb.com/partdetail/C2176211; ComponentLink3Description: LCSC Part URL; ComponentLink3URL: https://lcsc.com/product-detail/Multilayer-Ceramic-Capacitors-MLCC---SMD-SMT_Murata-Electronics-Murata-Electronics-GJM0335C1H3R0BB01D_C2176211.html
footprint CAP-0201 (0201 (0603M) Capacitor)
pins: 1, 2

## GJM0335C1H3R3BB01D
designator C?  Capacitance: 3.3pF  (hidden comment: *)
Capacitor, Ceramic (MLCC), 3.3pF, 50V, null, SMD 0201; Manufacturer: Murata Electronics; Manufacturer Part Number: GJM0335C1H3R3BB01D; Package Size: 0201; JLCPCB Basic Part: No; JLCPCB Part Number: C237517; Supplier 1: LCSC; Category: Capacitors - MLCC; Supplier Part Number 1: C237517; Voltage Rating: 50V; Temperature Coefficient: null; RoHS: Yes; ComponentLink1Description: Datasheet; ComponentLink1URL: https://wmsc.lcsc.com/wmsc/upload/file/pdf/v2/lcsc/2108182130_Murata-Electronics-GJM0335C1H3R3BB01D_C237517.pdf; ComponentLink2Description: JLCPCB Part URL; ComponentLink2URL: https://jlcpcb.com/partdetail/C237517; ComponentLink3Description: LCSC Part URL; ComponentLink3URL: https://lcsc.com/product-detail/Multilayer-Ceramic-Capacitors-MLCC---SMD-SMT_Murata-Electronics-Murata-Electronics-GJM0335C1H3R3BB01D_C237517.html
footprint CAP-0201 (0201 (0603M) Capacitor)
pins: 1, 2

## GJM0335C1H3R6BB01D
designator C?  Capacitance: 3.6pF  (hidden comment: *)
Capacitor, Ceramic (MLCC), 3.6pF, 50V, null, SMD 0201; Manufacturer: Murata Electronics; Manufacturer Part Number: GJM0335C1H3R6BB01D; Package Size: 0201; JLCPCB Basic Part: No; JLCPCB Part Number: C2180761; Supplier 1: LCSC; Category: Capacitors - MLCC; Supplier Part Number 1: C2180761; Voltage Rating: 50V; Temperature Coefficient: null; RoHS: Yes; ComponentLink1Description: Datasheet; ComponentLink1URL: https://wmsc.lcsc.com/wmsc/upload/file/pdf/v2/lcsc/2202041130_Murata-Electronics-GJM0335C1H3R6BB01D_C2180761.pdf; ComponentLink2Description: JLCPCB Part URL; ComponentLink2URL: https://jlcpcb.com/partdetail/C2180761; ComponentLink3Description: LCSC Part URL; ComponentLink3URL: https://lcsc.com/product-detail/Multilayer-Ceramic-Capacitors-MLCC---SMD-SMT_Murata-Electronics-Murata-Electronics-GJM0335C1H3R6BB01D_C2180761.html
footprint CAP-0201 (0201 (0603M) Capacitor)
pins: 1, 2

## GJM0335C1H3R9BB01D
designator C?  Capacitance: 3.9pF  (hidden comment: *)
Capacitor, Ceramic (MLCC), 3.9pF, 50V, null, SMD 0201; Manufacturer: Murata Electronics; Manufacturer Part Number: GJM0335C1H3R9BB01D; Package Size: 0201; JLCPCB Basic Part: No; JLCPCB Part Number: C2181774; Supplier 1: LCSC; Category: Capacitors - MLCC; Supplier Part Number 1: C2181774; Voltage Rating: 50V; Temperature Coefficient: null; RoHS: Yes; ComponentLink1Description: Datasheet; ComponentLink1URL: https://wmsc.lcsc.com/wmsc/upload/file/pdf/v2/lcsc/2202041230_Murata-Electronics-GJM0335C1H3R9BB01D_C2181774.pdf; ComponentLink2Description: JLCPCB Part URL; ComponentLink2URL: https://jlcpcb.com/partdetail/C2181774; ComponentLink3Description: LCSC Part URL; ComponentLink3URL: https://lcsc.com/product-detail/Multilayer-Ceramic-Capacitors-MLCC---SMD-SMT_Murata-Electronics-Murata-Electronics-GJM0335C1H3R9BB01D_C2181774.html
footprint CAP-0201 (0201 (0603M) Capacitor)
pins: 1, 2

## GJM0335C1H4R0CB01D
designator C?  Capacitance: 4pF  (hidden comment: *)
Capacitor, Ceramic (MLCC), 4pF, 50V, C0G, SMD 0201; Manufacturer: Murata Electronics; Manufacturer Part Number: GJM0335C1H4R0CB01D; Package Size: 0201; JLCPCB Basic Part: No; JLCPCB Part Number: C415414; Supplier 1: LCSC; Category: Capacitors - MLCC; Supplier Part Number 1: C415414; Voltage Rating: 50V; Temperature Coefficient: C0G; RoHS: Yes; ComponentLink1Description: Datasheet; ComponentLink1URL: https://wmsc.lcsc.com/wmsc/upload/file/pdf/v2/lcsc/2304140030_Murata-Electronics-GJM0335C1H4R0CB01D_C415414.pdf; ComponentLink2Description: JLCPCB Part URL; ComponentLink2URL: https://jlcpcb.com/partdetail/C415414; ComponentLink3Description: LCSC Part URL; ComponentLink3URL: https://lcsc.com/product-detail/Multilayer-Ceramic-Capacitors-MLCC---SMD-SMT_Murata-Electronics-Murata-Electronics-GJM0335C1H4R0CB01D_C415414.html
footprint CAP-0201 (0201 (0603M) Capacitor)
pins: 1, 2

## GJM0335C1H4R7BB01D
designator C?  Capacitance: 4.7pF  (hidden comment: *)
Capacitor, Ceramic (MLCC), 4.7pF, 50V, C0G, SMD 0201; Manufacturer: Murata Electronics; Manufacturer Part Number: GJM0335C1H4R7BB01D; Package Size: 0201; JLCPCB Basic Part: No; JLCPCB Part Number: C237518; Supplier 1: LCSC; Category: Capacitors - MLCC; Supplier Part Number 1: C237518; Voltage Rating: 50V; Temperature Coefficient: C0G; RoHS: Yes; ComponentLink1Description: Datasheet; ComponentLink1URL: https://wmsc.lcsc.com/wmsc/upload/file/pdf/v2/lcsc/2109101130_Murata-Electronics-GJM0335C1H4R7BB01D_C237518.pdf; ComponentLink2Description: JLCPCB Part URL; ComponentLink2URL: https://jlcpcb.com/partdetail/C237518; ComponentLink3Description: LCSC Part URL; ComponentLink3URL: https://lcsc.com/product-detail/Multilayer-Ceramic-Capacitors-MLCC---SMD-SMT_Murata-Electronics-Murata-Electronics-GJM0335C1H4R7BB01D_C237518.html
footprint CAP-0201 (0201 (0603M) Capacitor)
pins: 1, 2

## GJM0335C1H4R9BB01D
designator C?  Capacitance: 4.9pF  (hidden comment: *)
Capacitor, Ceramic (MLCC), 4.9pF, 50V, null, SMD 0201; Manufacturer: Murata Electronics; Manufacturer Part Number: GJM0335C1H4R9BB01D; Package Size: 0201; JLCPCB Basic Part: No; JLCPCB Part Number: C2180781; Supplier 1: LCSC; Category: Capacitors - MLCC; Supplier Part Number 1: C2180781; Voltage Rating: 50V; Temperature Coefficient: null; RoHS: Yes; ComponentLink1Description: Datasheet; ComponentLink1URL: https://wmsc.lcsc.com/wmsc/upload/file/pdf/v2/lcsc/2202041130_Murata-Electronics-GJM0335C1H4R9BB01D_C2180781.pdf; ComponentLink2Description: JLCPCB Part URL; ComponentLink2URL: https://jlcpcb.com/partdetail/C2180781; ComponentLink3Description: LCSC Part URL; ComponentLink3URL: https://lcsc.com/product-detail/Multilayer-Ceramic-Capacitors-MLCC---SMD-SMT_Murata-Electronics-Murata-Electronics-GJM0335C1H4R9BB01D_C2180781.html
footprint CAP-0201 (0201 (0603M) Capacitor)
pins: 1, 2

## GJM0335C1H5R6BB01D
designator C?  Capacitance: 5.6pF  (hidden comment: *)
Capacitor, Ceramic (MLCC), 5.6pF, 50V, C0G, SMD 0201; Manufacturer: Murata Electronics; Manufacturer Part Number: GJM0335C1H5R6BB01D; Package Size: 0201; JLCPCB Basic Part: No; JLCPCB Part Number: C237512; Supplier 1: LCSC; Category: Capacitors - MLCC; Supplier Part Number 1: C237512; Voltage Rating: 50V; Temperature Coefficient: C0G; RoHS: Yes; ComponentLink1Description: Datasheet; ComponentLink1URL: https://wmsc.lcsc.com/wmsc/upload/file/pdf/v2/lcsc/2304140030_Murata-Electronics-GJM0335C1H5R6BB01D_C237512.pdf; ComponentLink2Description: JLCPCB Part URL; ComponentLink2URL: https://jlcpcb.com/partdetail/C237512; ComponentLink3Description: LCSC Part URL; ComponentLink3URL: https://lcsc.com/product-detail/Multilayer-Ceramic-Capacitors-MLCC---SMD-SMT_Murata-Electronics-Murata-Electronics-GJM0335C1H5R6BB01D_C237512.html
footprint CAP-0201 (0201 (0603M) Capacitor)
pins: 1, 2

## GJM0335C1H5R6CB01D
designator C?  Capacitance: 5.6pF  (hidden comment: *)
Capacitor, Ceramic (MLCC), 5.6pF, null, null, SMD 0201; Manufacturer: Murata Electronics; Manufacturer Part Number: GJM0335C1H5R6CB01D; Package Size: 0201; JLCPCB Basic Part: No; JLCPCB Part Number: C913473; Supplier 1: LCSC; Category: Capacitors - MLCC; Supplier Part Number 1: C913473; Voltage Rating: null; Temperature Coefficient: null; RoHS: Yes; ComponentLink1Description: Datasheet; ComponentLink1URL: https://wmsc.lcsc.com/wmsc/upload/file/pdf/v2/lcsc/2308111814_Murata-Electronics-GJM0335C1H5R6CB01D_C913473.pdf; ComponentLink2Description: JLCPCB Part URL; ComponentLink2URL: https://jlcpcb.com/partdetail/C913473; ComponentLink3Description: LCSC Part URL; ComponentLink3URL: https://lcsc.com/product-detail/Multilayer-Ceramic-Capacitors-MLCC---SMD-SMT_Murata-Electronics-Murata-Electronics-GJM0335C1H5R6CB01D_C913473.html
footprint CAP-0201 (0201 (0603M) Capacitor)
pins: 1, 2

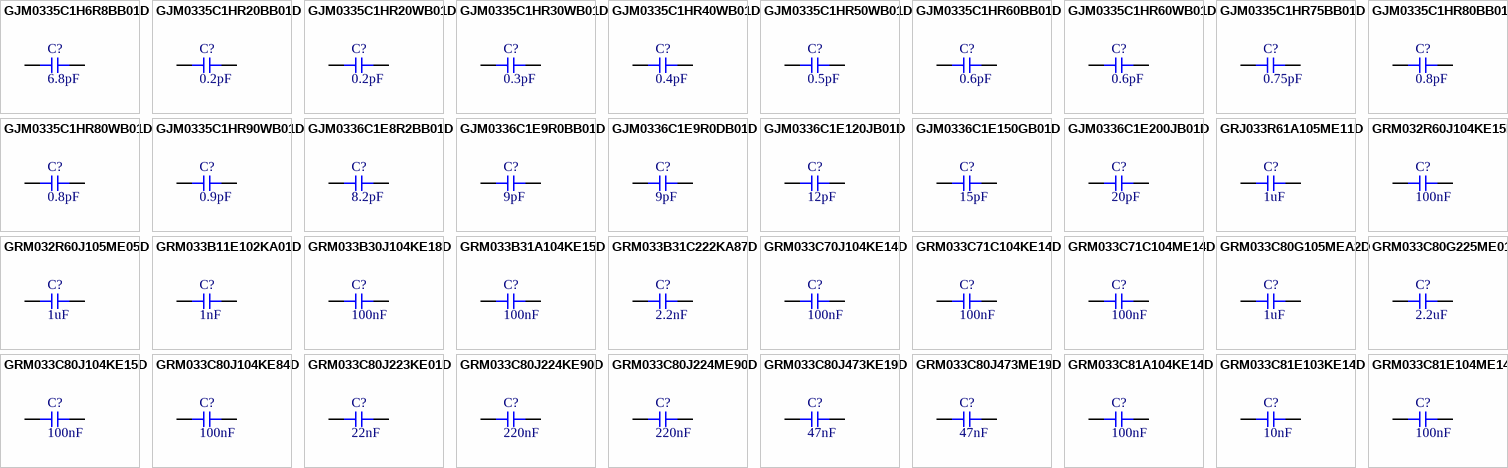
[diagram p16: symbols GJM0335C1H6R8BB01D to GRM033C81E104ME14D]

## GJM0335C1H6R8BB01D
designator C?  Capacitance: 6.8pF  (hidden comment: *)
Capacitor, Ceramic (MLCC), 6.8pF, 50V, C0G, SMD 0201; Manufacturer: Murata Electronics; Manufacturer Part Number: GJM0335C1H6R8BB01D; Package Size: 0201; JLCPCB Basic Part: No; JLCPCB Part Number: C237519; Supplier 1: LCSC; Category: Capacitors - MLCC; Supplier Part Number 1: C237519; Voltage Rating: 50V; Temperature Coefficient: C0G; RoHS: Yes; ComponentLink1Description: Datasheet; ComponentLink1URL: https://wmsc.lcsc.com/wmsc/upload/file/pdf/v2/lcsc/1912111437_Murata-Electronics-GJM0335C1H6R8BB01D_C237519.pdf; ComponentLink2Description: JLCPCB Part URL; ComponentLink2URL: https://jlcpcb.com/partdetail/C237519; ComponentLink3Description: LCSC Part URL; ComponentLink3URL: https://lcsc.com/product-detail/Multilayer-Ceramic-Capacitors-MLCC---SMD-SMT_Murata-Electronics-Murata-Electronics-GJM0335C1H6R8BB01D_C237519.html
footprint CAP-0201 (0201 (0603M) Capacitor)
pins: 1, 2
